# Altium footprint library bethu.PcbLib: 628 footprints (part 34 of 40)
Each footprint in its own frame and in the unit in brackets; x right, y up, seen from the top. Pads: shape width x height; smd on the part's side, far side on the other; paste and mask are expansions set on the pad; w line width, h text height; cw(c..) or ccw(c..) is an arc to the next point about the centre after c.
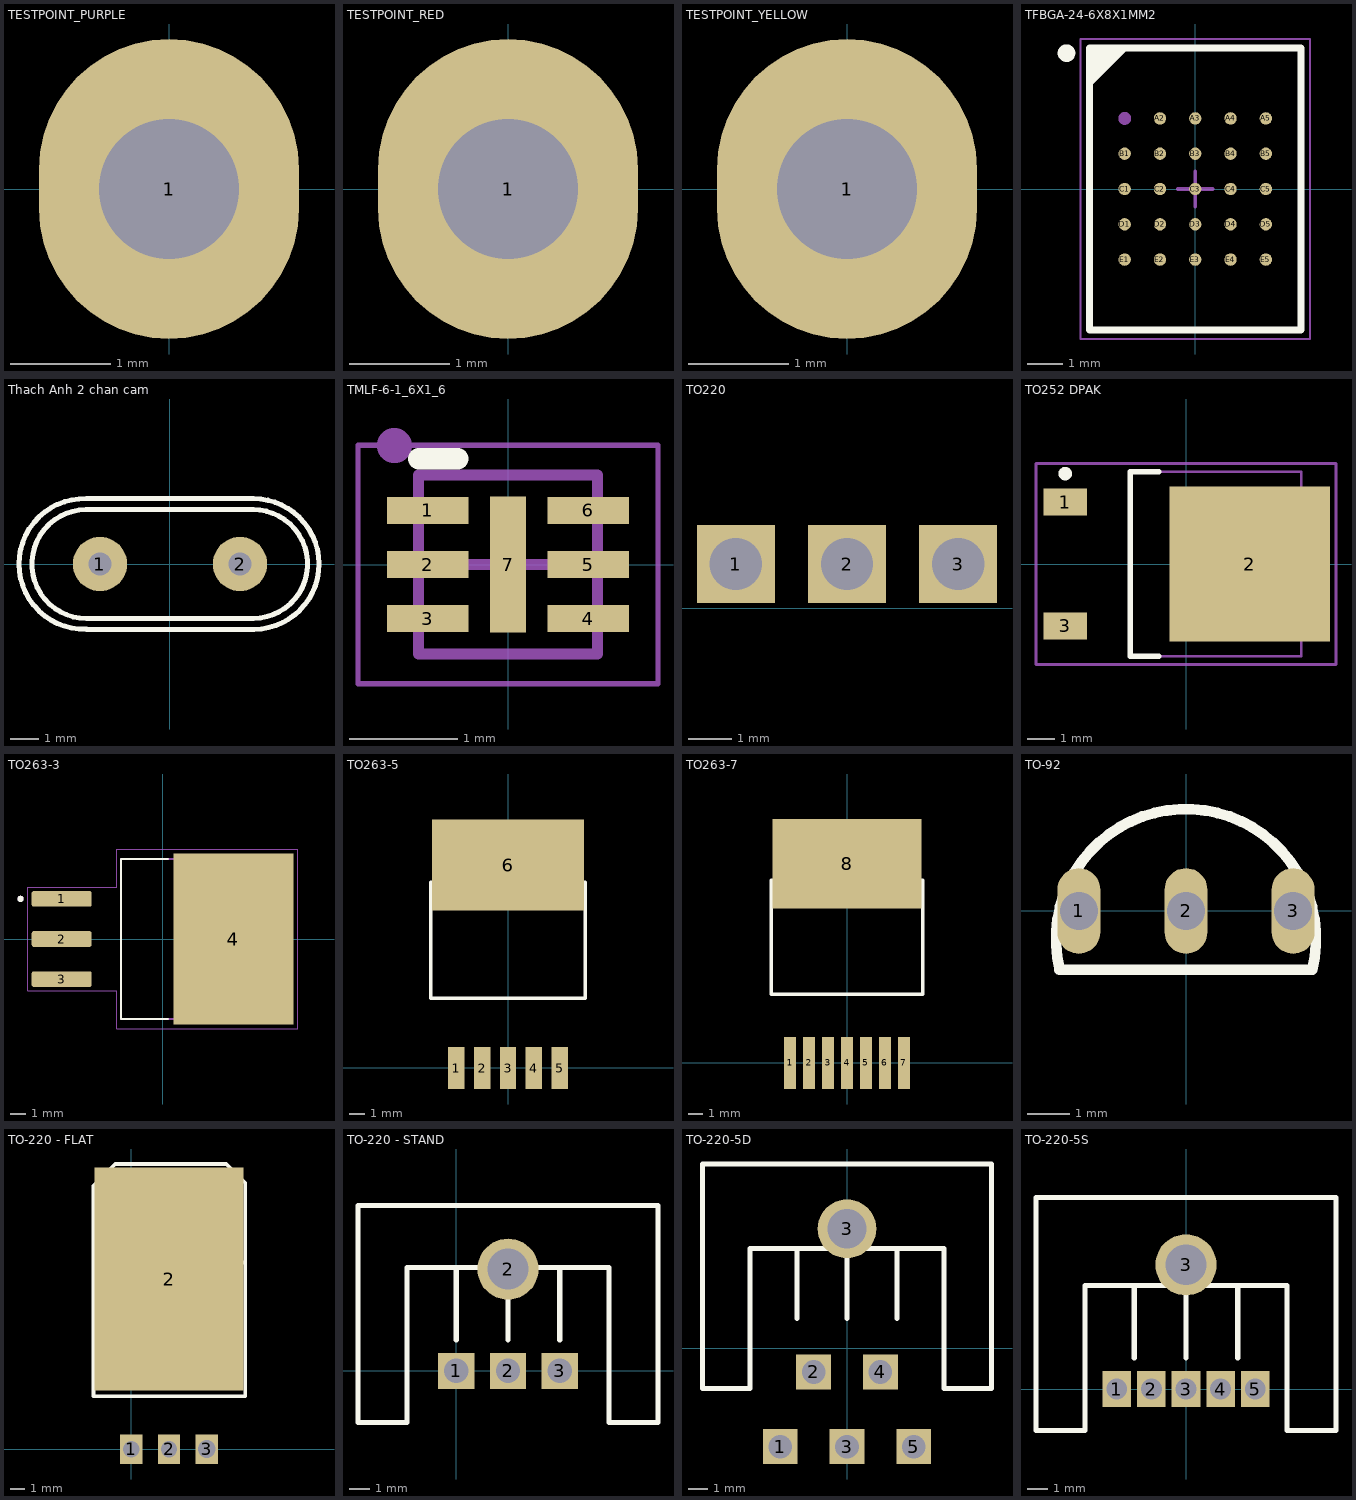
[diagram p33: the footprints below, top view; thin cyan lines are the x and y axes]

## TESTPOINT_PURPLE [mm] "Connect 1"
pads (1):
  oval 2.6x3 hole 1.4: 1(0,0)
3D body "User Library-Test Point Keystone - 5119 PURPLE.STEP": height 4.57, standoff -3.05, extent -1.27,-1.27 1.27,1.27

## TESTPOINT_RED [mm] "Connect 1"
pads (1):
  oval 2.6x3 hole 1.4: 1(0,0)
3D body "User Library-Test Point Keystone - 5000 RED.STEP": height 4.57, standoff -3.05, extent -1.27,-1.27 1.27,1.27

## TESTPOINT_YELLOW [mm] "Connect 1"
pads (1):
  oval 2.6x3 hole 1.4: 1(0,0)
3D body "User Library-Test Point Keystone - 5004 YELLOW.STEP": height 4.57, standoff -3.05, extent -1.27,-1.27 1.27,1.27

## TFBGA-24-6X8X1MM2 [mm]
height 1.2
pads (24):
  round 0.35 smd: A2(-1,2) A3(0,2) A4(1,2) A5(2,2) B1(-2,1) B2(-1,1) B3(0,1) B4(1,1) B5(2,1) C1(-2,0) C2(-1,0) C3(0,0) C4(1,0) C5(2,0) D1(-2,-1) D2(-1,-1) D3(0,-1) D4(1,-1) D5(2,-1) E1(-2,-2) E2(-1,-2) E3(0,-2) E4(1,-2) E5(2,-2)
Top Overlay:
  circle w0.25: c-3.65,3.85 r0.125
  region: -2,4 -3,3 -3,4
  lines w0.2: -3,3 -2,4 ; -3,-4 -3,4 3,4 3,-4 -3,-4
Mechanical 13:
  circle w0.254: c-2,2 r0.053
  lines w0.1: -3,-4 -3,4 3,4 3,-4 -3,-4
  text ".Designator" at -4.998,-0.333 h1
Mechanical 15:
  lines w0.05: -3.25,-4.25 -3.25,4.25 3.25,4.25 3.25,-4.25 -3.25,-4.25
  lines w0.1: -0.5,0 0.5,0 ; 0,-0.5 0,0.5
3D body "TFBGA-24-6X8X1MM2.step": height 1.2, standoff 0, extent -3,-4 3,4

## Thach Anh 2 chan cam [mm]
pads (2):
  round 1.905 hole 0.8: 1(-2.45,0) 2(2.45,0)
Top Overlay:
  lines w0.178: -2.939,1.905 ccw(c-2.927,0) -2.921,-1.905 2.921,-1.905 ccw(c2.908,0) 2.903,1.905 ; -2.922,-2.283 cw(c-2.998,0.001) -2.921,2.286 2.921,2.286 cw(c2.928,0) 2.943,-2.286 ; -2.921,-2.286 2.921,-2.286 ; -2.921,1.905 2.921,1.905
3D body "SW3dPS-HP49US.STEP": height 3.5, standoff -4, extent -5.675,-2.364 5.675,2.286

## TMLF-6-1_6X1_6 [mm]
height 0.6
pads (7):
  rect 0.75x0.25 smd mask+0.15: 1(-0.74,0.5) 2(-0.74,0) 3(-0.74,-0.5) 4(0.74,-0.5) 5(0.74,0) 6(0.74,0.5)
  rect 0.33x1.26 smd mask+0.15: 7(0,0)
Top Overlay:
  lines w0.2: -0.825,0.975 -0.465,0.975
Mechanical 13:
  circle w0.3: c-1.05,1.098 r0.011
  lines w0.1: -0.825,-0.825 -0.825,0.825 0.825,0.825 0.825,-0.825 -0.825,-0.825
  text "'.Designator'" at -5.815,-0.9 h1
Mechanical 15:
  lines w0.05: -1.385,-1.1 -1.385,1.1 1.385,1.1 1.385,-1.1 -1.385,-1.1
  lines w0.1: -0.5,0 0.5,0 ; 0,-0.5 0,0.5
3D body "TMLF-6-1_6X1_6.step": height 0.6, standoff 0, extent -0.826,-0.825 0.826,0.825

## TO220 [mil]
pads (3):
  rect 70x70 hole 47.24 unplated: 1(90,40) 2(190,40) 3(290,40)
3D body "User Library-TO-220-3.step": height 318.11, standoff -814.96, extent -4.88,-40 384.88,137.17

## TO252 DPAK [mm] "D-PAK, 3-Pads, Body 6.3x6.8mm (max), IPC Medium Density"
height 2.4
pads (3):
  rect 1.6x1 smd: 1(-4.45,2.28) 3(-4.45,-2.28)
  rect 5.9x5.7 smd: 2(2.35,0)
Top Overlay:
  circle w0.25: c-4.45,3.33 r0.125
  lines w0.2: -1,-3.4 -2.05,-3.4 -2.05,3.4 -1,3.4
Mechanical 13:
  lines w0.1: -2.05,-3.4 -2.05,3.4 4.25,3.4 4.25,-3.4 -2.05,-3.4
Mechanical 15:
  lines w0.1: -0.5,0 0.5,0 ; 0,-0.5 0,0.5 ; -5.525,-3.7 -5.525,3.7 5.525,3.7 5.525,-3.7 -5.525,-3.7
3D body "SW3DPS-TO-252-DEFAULT.STEP": height 2.3, standoff 0, extent -4.711,-3.29 4.989,3.29

## TO263-3 [mm]
pads (4):
  rrect25% 3.79x0.99 smd: 1(-6.4,2.54) 2(-6.4,0) 3(-6.4,-2.54)
  rect 7.62x10.84 smd paste-6: 4(4.48,0)
Top Overlay:
  circle w0.2: c-9,2.54 r0.1
  lines w0.127: 0.35,-5.08 -2.648,-5.08 -2.648,5.08 0.35,5.08
Top Paste:
  region: 5.205,0.27 3.755,0.27 3.755,1.53 5.205,1.53
  region: 5.205,2.07 3.755,2.07 3.755,3.33 5.205,3.33
  region: 5.205,3.87 3.755,3.87 3.755,5.13 5.205,5.13
  region: 5.205,-1.53 3.755,-1.53 3.755,-0.27 5.205,-0.27
  region: 5.205,-3.33 3.755,-3.33 3.755,-2.07 5.205,-2.07
  region: 5.205,-5.13 3.755,-5.13 3.755,-3.87 5.205,-3.87
  region: 7.745,0.27 6.295,0.27 6.295,1.53 7.745,1.53
  region: 7.745,2.07 6.295,2.07 6.295,3.33 7.745,3.33
  region: 7.745,3.87 6.295,3.87 6.295,5.13 7.745,5.13
  region: 7.745,-1.53 6.295,-1.53 6.295,-0.27 7.745,-0.27
  region: 7.745,-3.33 6.295,-3.33 6.295,-2.07 7.745,-2.07
  region: 7.745,-5.13 6.295,-5.13 6.295,-3.87 7.745,-3.87
  region: 2.665,0.27 1.215,0.27 1.215,1.53 2.665,1.53
  region: 2.665,2.07 1.215,2.07 1.215,3.33 2.665,3.33
  region: 2.665,3.87 1.215,3.87 1.215,5.13 2.665,5.13
  region: 2.665,-1.53 1.215,-1.53 1.215,-0.27 2.665,-0.27
  region: 2.665,-3.33 1.215,-3.33 1.215,-2.07 2.665,-2.07
  region: 2.665,-5.13 1.215,-5.13 1.215,-3.87 2.665,-3.87
Mechanical 13:
  circle w0.2: c-9,2.54 r0.1
  lines w0.127: -2.648,-5.08 6.373,-5.08 6.373,5.08 -2.648,5.08 -2.648,-5.08
Mechanical 15:
  lines w0.05: -8.545,-3.285 -8.545,3.285 -2.898,3.285 -2.898,5.67 8.54,5.67 8.54,-5.67 -2.898,-5.67 -2.898,-3.285 -8.545,-3.285
3D body "step_temp.STEP": height 4.83, standoff -0.25, extent -7.62,-5.08 7.62,5.08

## TO263-5 [mm]
pads (6):
  rect 1.07x2.75 smd: 1(-3.4,-0.025) 2(-1.7,-0.025) 3(0,-0.025) 4(1.7,-0.025) 5(3.4,-0.025)
  rect 10x6 smd: 6(0,13.335)
Top Overlay:
  lines w0.254: -5.08,4.572 5.08,4.572 5.08,12.192 -5.08,12.192 -5.08,4.572
3D body "SW3dPS-TO263-5.STEP": height 4.79, standoff -0.01, extent -5,-0.381 5,15.289

## TO263-7 [mm]
pads (8):
  rect 0.8x3.5 smd: 1(-3.81,-0.025) 2(-2.54,-0.025) 3(-1.27,-0.025) 4(0,-0.025) 5(1.27,-0.025) 6(2.54,-0.025) 7(3.81,-0.025)
  rect 10x6 smd: 8(0,13.335)
Top Overlay:
  lines w0.254: -5.08,4.572 -5.08,12.192 5.08,12.192 5.08,4.572 -5.08,4.572
3D body "SW3dPS-TO263-7-1.STEP": height 4.79, standoff -0.01, extent -5,-0.381 5,15.289

## TO-92 [mil] "TO, Flat Index; 3 In-Line, Axial Leads; Body Dia. 4.8mm"
pads (3):
  oval 40x80 hole 35.43: 1(-100,0) 2(0,0) 3(100,0)
Top Overlay:
  lines w10: -118,-55 117,-55 ; -117.83,-54.92 cw(c0,-26.18) 117.83,-54.92
3D body "User Library-TO-92-2_54-line-1.STEP": height 401.57, standoff -86.61, extent -110.17,-69.73 110.17,85

## TO-220 - FLAT [mm]
pads (4):
  rect 1.5x2 hole 1.1: 1(0,0) 2(2.54,0)
  rect 10x15 smd: 2(2.54,11.43)
  rect 1.5x2 hole 1.2: 3(5.08,0)
Top Overlay:
  lines w0.254: -2.54,5.861 -2.54,17.71 -1.073,19.177 6.395,19.177 7.671,17.901 7.671,3.562 -2.54,3.562 -2.54,12.554 7.671,12.554
3D body "TO220_NAM.step": height 4.45, standoff -1.79, extent -2.54,-0.19 7.62,19.09

## TO-220 - STAND [mm]
pads (4):
  rect 1.778x1.778 hole 1.2 unplated: 1(0,0) 2(2.54,0) 3(5.08,0)
  round 3 hole 2 unplated: 2(2.54,5)
Top Overlay:
  lines w0.254: 0,1.524 0,5.08 ; 2.54,1.524 2.54,5.08 ; 5.08,1.524 5.08,5.08 ; -4.826,-2.54 -4.826,8.128 9.906,8.128 9.906,7.366 9.906,-2.54 7.493,-2.54 7.493,5.08 -2.413,5.08 -2.413,-2.54 -4.826,-2.54
3D body "User Library-TO-220-3.step": height 8.08, standoff -20.7, extent -2.41,-2.032 7.49,2.468
3D body "SW3dPS-heatsink TO126.STEP": height 25, standoff -3.8, extent -4.826,-2.607 9.955,8.195

## TO-220-5D [mm]
pads (6):
  rect 1.778x1.778 hole 1.2 unplated: 1(-3.4,-5) 2(-1.7,-1.2) 3(0,-5) 4(1.7,-1.2) 5(3.4,-5)
  round 3 hole 2 unplated: 3(0,6.096)
Top Overlay:
  lines w0.254: -2.54,1.524 -2.54,5.08 ; 0,1.524 0,5.08 ; 2.54,1.524 2.54,5.08 ; -7.366,-2.032 -7.366,9.398 7.366,9.398 7.366,7.366 7.366,-2.032 4.953,-2.032 4.953,5.08 -4.953,5.08 -4.953,-2.032 -7.366,-2.032
3D body "SW3dPS-heatsink TO126.STEP": height 25, standoff -3.8, extent -7.415,-1.464 7.366,9.338
3D body "SW3dPS-TO220-5.STEP": height 2.14, standoff -21.85, extent -5.08,-5.207 5.08,3.033

## TO-220-5S [mm]
pads (6):
  rect 1.4x1.778 hole 1.02 unplated: 1(-3.4,0) 2(-1.7,0) 3(0,0) 4(1.7,0) 5(3.4,0)
  round 3 hole 2 unplated: 3(0,6.096)
Top Overlay:
  lines w0.254: -2.54,1.524 -2.54,5.08 ; 0,1.524 0,5.08 ; 2.54,1.524 2.54,5.08 ; -7.366,-2.032 -7.366,9.398 7.366,9.398 7.366,7.366 7.366,-2.032 4.953,-2.032 4.953,5.08 -4.953,5.08 -4.953,-2.032 -7.366,-2.032
3D body "SW3dPS-heatsink TO126.STEP": height 25, standoff -3.8, extent -7.415,-1.464 7.366,9.338
3D body "User Library-to-220-5 v2.STEP": height 6.82, standoff -21, extent -5.08,-2.029 5.08,2.921